# Altium footprint library 3.16-变压器.PcbLib: 17 footprints (part 2 of 2)
Each footprint in its own frame and in the unit in brackets; x right, y up, seen from the top. Pads: shape width x height; smd on the part's side, far side on the other; paste and mask are expansions set on the pad; w line width, h text height; cw(c..) or ccw(c..) is an arc to the next point about the centre after c.
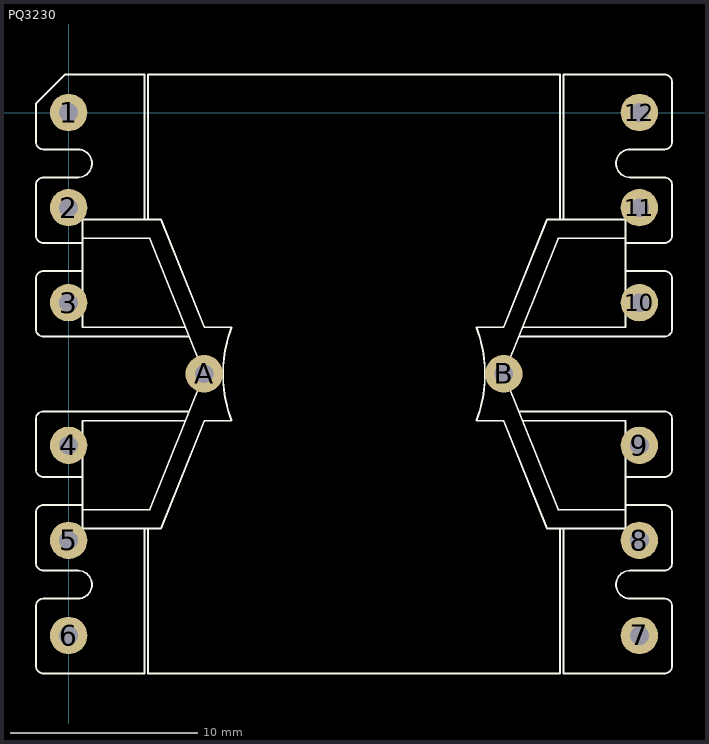
[diagram p1: the footprint, top view; thin cyan lines are the x and y axes]

## PQ3230 [mm] "[ PCBѧϰȺ514746572 ]"
height 20.5
pads (14):
  round 2 hole 1: 1(0,0) 2(0,-5.08) 3(0,-10.16) 4(0,-17.78) 5(0,-22.86) 6(0,-27.94) 7(30.5,-27.94) 8(30.5,-22.86) 9(30.5,-17.78) 10(30.5,-10.16) 11(30.5,-5.08) 12(30.5,0) A(7.25,-13.959) B(23.25,-13.959)
Top Overlay:
  lines w0.1: 4.05,-22.22 4.05,-29.97 -1.34,-29.97 cw(c-1.34,-29.56) -1.75,-29.56 -1.75,-26.38 cw(c-1.34,-26.38) -1.34,-25.97 0.5,-25.97 ccw(c0.5,-25.22) 0.5,-24.47 -1.34,-24.47 cw(c-1.34,-24.06) -1.75,-24.06 -1.75,-21.38 cw(c-1.34,-21.38) -1.34,-20.97 0.749,-20.97 0.749,-19.47 -1.34,-19.47 cw(c-1.34,-19.06) -1.75,-19.06 -1.75,-16.38 cw(c-1.34,-16.38) -1.34,-15.97 6.451,-15.97 ; 4.05,-5.72 4.05,2.03 -0.195,2.03 -1.75,0.475 -1.75,-1.56 ccw(c-1.34,-1.56) -1.34,-1.97 0.5,-1.97 cw(c0.5,-2.72) 0.5,-3.47 -1.34,-3.47 ccw(c-1.34,-3.88) -1.75,-3.88 -1.75,-6.56 ccw(c-1.34,-6.56) -1.34,-6.97 0.749,-6.97 0.749,-8.47 -1.34,-8.47 ccw(c-1.34,-8.88) -1.75,-8.88 -1.75,-11.56 ccw(c-1.34,-11.56) -1.34,-11.97 6.451,-11.97 ; 4.25,-22.22 4.25,-29.97 26.25,-29.97 26.25,-22.22 ; 4.25,-5.72 4.25,2.03 26.25,2.03 26.25,-5.72 ; 6.25,-16.47 0.75,-16.47 0.75,-21.22 ; 6.25,-11.47 0.75,-11.47 0.75,-6.72 ; 7.25,-13.981 4.341,-21.22 0.75,-21.22 ; 7.25,-13.959 4.341,-6.72 0.75,-6.72 ; 8.699,-16.47 7.25,-16.47 4.939,-22.22 0.75,-22.22 0.75,-21.22 ; 8.699,-11.47 7.25,-11.47 4.939,-5.72 0.75,-5.72 0.75,-6.72 ; 8.71,-16.466 cw(c15.25,-13.97) 8.71,-11.474 ; 21.79,-16.466 ccw(c15.25,-13.97) 21.79,-11.474 ; 21.801,-16.47 23.25,-16.47 25.561,-22.22 29.75,-22.22 29.75,-21.22 ; 21.801,-11.47 23.25,-11.47 25.561,-5.72 29.75,-5.72 29.75,-6.72 ; 23.25,-13.981 26.159,-21.22 29.75,-21.22 ; 23.25,-13.959 26.159,-6.72 29.75,-6.72 ; 24.049,-15.97 31.84,-15.97 cw(c31.84,-16.38) 32.25,-16.38 32.25,-19.06 cw(c31.84,-19.06) 31.84,-19.47 29.751,-19.47 29.751,-20.97 31.84,-20.97 cw(c31.84,-21.38) 32.25,-21.38 32.25,-24.06 cw(c31.84,-24.06) 31.84,-24.47 30,-24.47 ccw(c30,-25.22) 30,-25.97 31.84,-25.97 cw(c31.84,-26.38) 32.25,-26.38 32.25,-29.56 cw(c31.84,-29.56) 31.84,-29.97 26.45,-29.97 26.45,-22.22 ; 24.049,-11.97 31.84,-11.97 ccw(c31.84,-11.56) 32.25,-11.56 32.25,-8.88 ccw(c31.84,-8.88) 31.84,-8.47 29.751,-8.47 29.751,-6.97 31.84,-6.97 ccw(c31.84,-6.56) 32.25,-6.56 32.25,-3.88 ccw(c31.84,-3.88) 31.84,-3.47 30,-3.47 cw(c30,-2.72) 30,-1.97 31.84,-1.97 ccw(c31.84,-1.56) 32.25,-1.56 32.25,1.62 ccw(c31.84,1.62) 31.84,2.03 26.45,2.03 26.45,-5.72 ; 24.25,-16.47 29.75,-16.47 29.75,-21.22 ; 24.25,-11.47 29.75,-11.47 29.75,-6.72
3D body "pq-32.STEP": height 30.2, standoff -4.7, extent -1.671,-30.046 32.329,1.953